# Altium footprint library NEST.PcbLib: 28 footprints (part 2 of 2)
Each footprint in its own frame and in the unit in brackets; x right, y up, seen from the top. Pads: shape width x height; smd on the part's side, far side on the other; paste and mask are expansions set on the pad; w line width, h text height; cw(c..) or ccw(c..) is an arc to the next point about the centre after c.
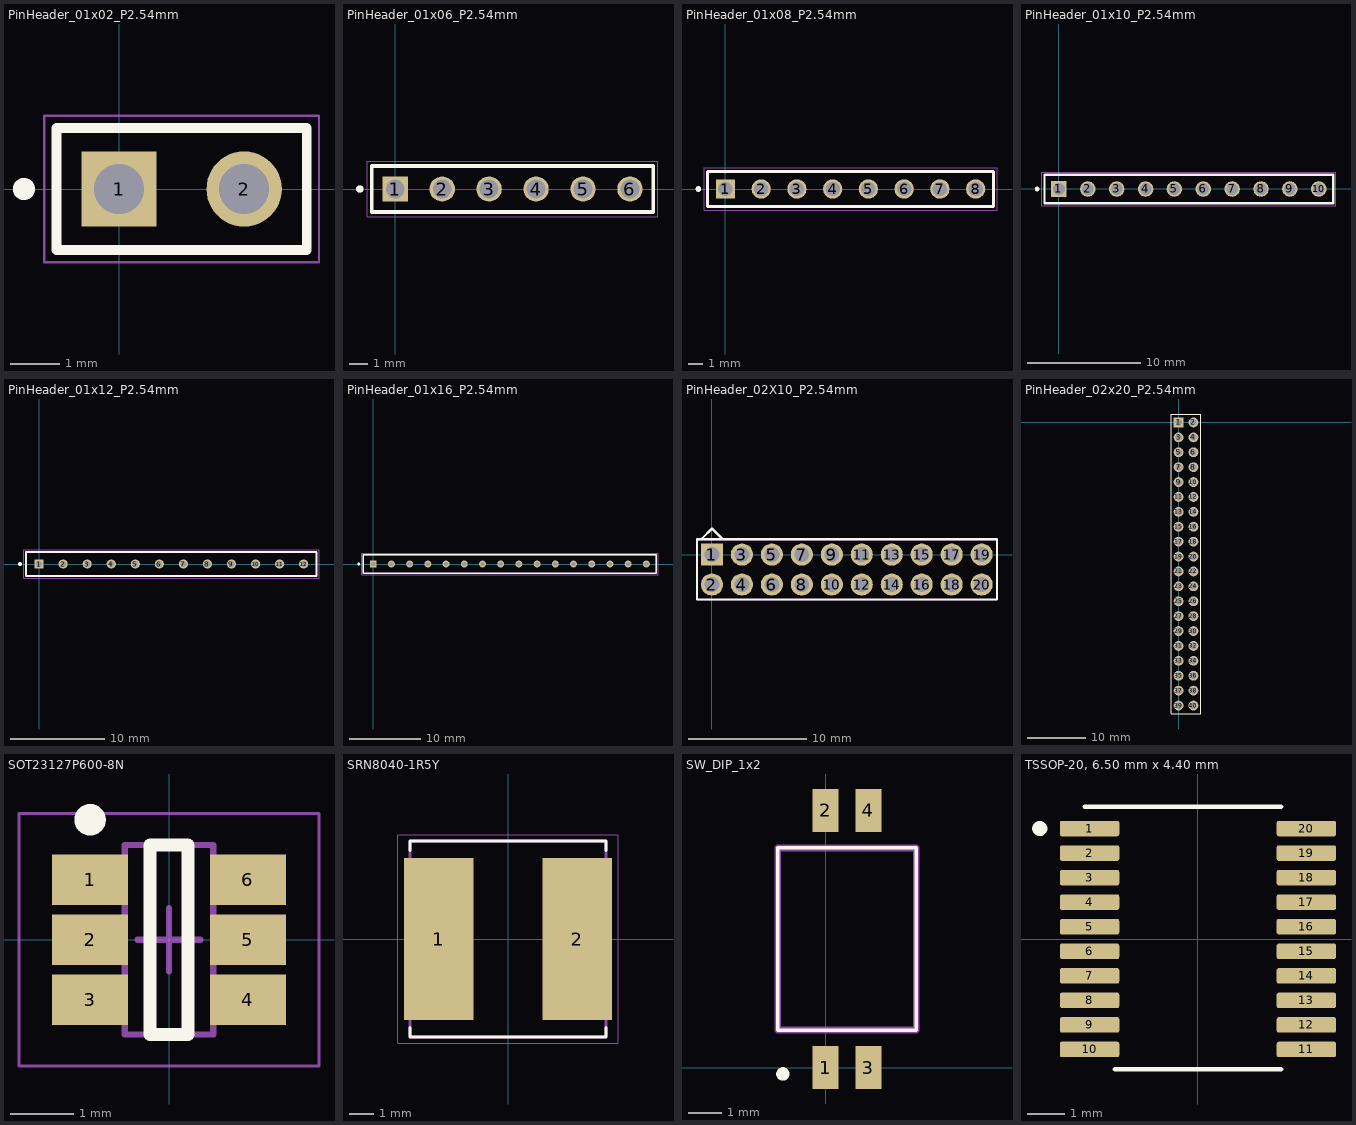
[diagram p1: the footprints below, top view; thin cyan lines are the x and y axes]

## PinHeader_01x02_P2.54mm [mm]
pads (2):
  rect 1.53x1.53 hole 1.02: 1(0,0)
  round 1.53 hole 1.02: 2(2.54,0)
Top Overlay:
  circle w0.25: c-1.93,0 r0.1
  lines w0.2: -1.27,-1.24 3.81,-1.24 3.81,1.24 -1.27,1.24 -1.27,-1.24
Mechanical 13:
  circle w0.2: c-1.93,0 r0.1
  lines w0.1: -1.27,-1.24 -1.27,1.24 3.81,1.24 3.81,-1.24 -1.27,-1.24
Mechanical 15:
  lines w0.05: -1.52,-1.49 -1.52,1.49 4.06,1.49 4.06,-1.49 -1.52,-1.49
3D body "Pin Header 1x2 TH Pitch 2.54mm.stp": height 9.5, standoff -3.2, extent -1.245,-1.347 3.835,1.193

## PinHeader_01x06_P2.54mm [mm]
pads (6):
  rect 1.37x1.37 / inner round 1.37 / far side rect 1.37x1.37 hole 1.02: 1(0,0)
  round 1.37 hole 1.02: 2(2.54,0) 3(5.08,0) 4(7.62,0) 5(10.16,0) 6(12.7,0)
Top Overlay:
  circle w0.2: c-1.92,0 r0.1
  lines w0.2: -1.27,-1.245 13.97,-1.245 13.97,1.245 -1.27,1.245 -1.27,-1.245
Mechanical 13:
  circle w0.2: c-1.92,0 r0.1
  lines w0.1: -1.27,-1.245 -1.27,1.245 13.97,1.245 13.97,-1.245 -1.27,-1.245
Mechanical 15:
  lines w0.05: -1.52,-1.495 -1.52,1.495 14.22,1.495 14.22,-1.495 -1.52,-1.495
3D body "Pin Header 1x6 TH Pitch 2.54mm.stp": height 9.5, standoff -3.2, extent -1.27,-1.296 13.97,1.245

## PinHeader_01x08_P2.54mm [mm]
pads (8):
  rect 1.37x1.37 / inner round 1.37 / far side rect 1.37x1.37 hole 1.02: 1(0,0)
  round 1.37 hole 1.02: 2(2.54,0) 3(5.08,0) 4(7.62,0) 5(10.16,0) 6(12.7,0) 7(15.24,0) 8(17.78,0)
Top Overlay:
  circle w0.2: c-1.92,0 r0.1
  lines w0.2: -1.27,-1.245 -1.27,1.245 19.05,1.245 19.05,-1.245 -1.27,-1.245
Mechanical 13:
  circle w0.2: c-1.92,0 r0.1
  lines w0.1: -1.27,-1.245 19.05,-1.245 19.05,1.245 -1.27,1.245 -1.27,-1.245
Mechanical 15:
  lines w0.05: -1.52,-1.495 19.3,-1.495 19.3,1.495 -1.52,1.495 -1.52,-1.495
3D body "Pin Header 1x8 TH Pitch 2.54mm.stp": height 9.5, standoff -3.2, extent -1.27,-1.27 19.05,1.27

## PinHeader_01x10_P2.54mm [mm]
pads (10):
  rect 1.37x1.37 / inner round 1.37 / far side rect 1.37x1.37 hole 1.02: 1(0,0)
  round 1.37 hole 1.02: 2(2.54,0) 3(5.08,0) 4(7.62,0) 5(10.16,0) 6(12.7,0) 7(15.24,0) 8(17.78,0) 9(20.32,0) 10(22.86,0)
Top Overlay:
  circle w0.2: c-1.92,0 r0.1
  lines w0.2: -1.27,-1.245 -1.27,1.245 24.13,1.245 24.13,-1.245 -1.27,-1.245
Mechanical 13:
  circle w0.2: c-1.92,0 r0.1
  lines w0.1: -1.27,-1.245 24.13,-1.245 24.13,1.245 -1.27,1.245 -1.27,-1.245
Mechanical 15:
  lines w0.05: -1.52,-1.495 24.38,-1.495 24.38,1.495 -1.52,1.495 -1.52,-1.495
3D body "Pin Header 1x10 TH Pitch 2.54mm.stp": height 9.5, standoff -3.2, extent -1.27,-1.27 24.13,1.27

## PinHeader_01x12_P2.54mm [mm]
pads (12):
  rect 0.96x0.96 hole 0.61: 1(0,0)
  round 0.96 hole 0.61: 2(2.54,0) 3(5.08,0) 4(7.62,0) 5(10.16,0) 6(12.7,0) 7(15.24,0) 8(17.78,0) 9(20.32,0) 10(22.86,0) 11(25.4,0) 12(27.94,0)
Top Overlay:
  circle w0.2: c-2.022,0 r0.1
  lines w0.2: -1.372,-1.27 29.312,-1.27 29.312,1.27 -1.372,1.27 -1.372,-1.27
Mechanical 13:
  circle w0.2: c-2.022,0 r0.1
  lines w0.1: -1.372,-1.27 29.312,-1.27 29.312,1.27 -1.372,1.27 -1.372,-1.27
Mechanical 15:
  lines w0.05: -1.622,-1.52 29.562,-1.52 29.562,1.52 -1.622,1.52 -1.622,-1.52
3D body "Pin Header 1x12 TH Pitch 2.54mm.stp": height 9.5, standoff -3.2, extent -1.27,-1.27 29.21,1.27

## PinHeader_01x16_P2.54mm [mm]
pads (16):
  rect 0.96x0.96 hole 0.61: 1(0,0)
  round 0.96 hole 0.61: 2(2.54,0) 3(5.08,0) 4(7.62,0) 5(10.16,0) 6(12.7,0) 7(15.24,0) 8(17.78,0) 9(20.32,0) 10(22.86,0) 11(25.4,0) 12(27.94,0) 13(30.48,0) 14(33.02,0) 15(35.56,0) 16(38.1,0)
Top Overlay:
  circle w0.2: c-2.022,0 r0.1
  lines w0.2: -1.372,-1.27 -1.372,1.27 39.472,1.27 39.472,-1.27 -1.372,-1.27
Mechanical 13:
  circle w0.2: c-2.022,0 r0.1
  lines w0.1: -1.372,-1.27 -1.372,1.27 39.472,1.27 39.472,-1.27 -1.372,-1.27
Mechanical 15:
  lines w0.05: -1.622,-1.52 -1.622,1.52 39.722,1.52 39.722,-1.52 -1.622,-1.52
3D body "Pin Header 1x16 TH Pitch 2.54mm.stp": height 9.5, standoff -3.2, extent -1.27,-1.27 39.37,1.27

## PinHeader_02X10_P2.54mm [mm]
pads (20):
  rect 1.875x1.875 hole 1.25: 1(0,0)
  round 1.875 hole 1.25: 2(0,-2.54) 3(2.54,0) 4(2.54,-2.54) 5(5.08,0) 6(5.08,-2.54) 7(7.62,0) 8(7.62,-2.54) 9(10.16,0) 10(10.16,-2.54) 11(12.7,0) 12(12.7,-2.54) 13(15.24,0) 14(15.24,-2.54) 15(17.78,0) 16(17.78,-2.54) 17(20.32,0) 18(20.32,-2.54) 19(22.86,0) 20(22.86,-2.54)
Top Overlay:
  lines w0.2: -1.26,1.305 -1.27,1.305 ; -0.864,1.346 0,2.21 0.838,1.372 ; -1.27,1.305 -1.27,-3.81 24.165,-3.81 24.165,1.305 -1.27,1.305
Mechanical 15:
  lines w0.1: -1.27,-3.81 24.13,-3.81 24.13,1.27 -1.27,1.27 -1.27,-3.81
3D body "TSW-110-07-S-D.stp": height 10.67, standoff -2.79, extent -1.27,-3.81 24.13,1.27

## PinHeader_02x20_P2.54mm [mm]
pads (40):
  rect 1.67x1.67 hole 1.1: 1(0,0)
  round 1.67 hole 1.1: 2(2.54,0) 3(0,-2.54) 4(2.54,-2.54) 5(0,-5.08) 6(2.54,-5.08) 7(0,-7.62) 8(2.54,-7.62) 9(0,-10.16) 10(2.54,-10.16) 11(0,-12.7) 12(2.54,-12.7) 13(0,-15.24) 14(2.54,-15.24) 15(0,-17.78) 16(2.54,-17.78) 17(0,-20.32) 18(2.54,-20.32) 19(0,-22.86) 20(2.54,-22.86) 21(0,-25.4) 22(2.54,-25.4) 23(0,-27.94) 24(2.54,-27.94) 25(0,-30.48) 26(2.54,-30.48) 27(0,-33.02) 28(2.54,-33.02) 29(0,-35.56) 30(2.54,-35.56) 31(0,-38.1) 32(2.54,-38.1) 33(0,-40.64) 34(2.54,-40.64) 35(0,-43.18) 36(2.54,-43.18) 37(0,-45.72) 38(2.54,-45.72) 39(0,-48.26) 40(2.54,-48.26)
Top Overlay:
  lines w0.2: -1.27,-49.705 -1.27,1.445 2.54,1.445 3.782,1.445 3.81,1.417 3.81,0 3.81,-49.705 -1.27,-49.705
3D body "M20-9762042.stp": height 8.38, standoff -3.1, extent -1.27,-49.53 3.81,1.27

## SOT23127P600-8N [mm]
height 1.1
pads (6):
  rect 1.2x0.8 smd: 1(-1.25,0.95) 2(-1.25,0) 3(-1.25,-0.95) 4(1.25,-0.95) 5(1.25,0) 6(1.25,0.95)
Top Overlay:
  circle w0.25: c-1.25,1.9 r0.125
  lines w0.2: -0.3,-1.5 -0.3,1.5 0.3,1.5 0.3,-1.5 -0.3,-1.5
Mechanical 13:
  lines w0.1: -0.7,-1.5 0.7,-1.5 0.7,1.5 -0.7,1.5 -0.7,-1.5
Mechanical 15:
  lines w0.05: -2.375,-2 2.375,-2 2.375,2 -2.375,2 -2.375,-2
  lines w0.1: -0.5,0 0.5,0 ; 0,-0.5 0,0.5
3D body "SOT23127P600-8N.step": height 1.1, standoff 0, extent -1.3,-1.5 1.3,1.5

## SRN8040-1R5Y [mm] "Power Inductors - SMD 1.5uH 30% SMD 8040"
pads (2):
  rect 2.85x6.6 smd: 1(-2.825,0) 2(2.825,0)
Top Overlay:
  lines w0.127: -4,-3.615 -4,-4 4,-4 4,-3.615 ; -4,3.615 -4,4 4,4 4,3.615
Mechanical 13:
  lines w0.127: -4,-4 -4,4 4,4 4,-4 -4,-4
Mechanical 15:
  lines w0.05: -4.5,-4.25 4.5,-4.25 4.5,4.25 -4.5,4.25 -4.5,-4.25
3D body "SRN8040-1RY.STEP": height 4, standoff 0, extent -4,-4.025 4,3.975

## SW_DIP_1x2 [mm] "DIP Switches / SIP Switches DIP Switch, SPST, 1.27 pitch, flat actuator, SMT, Tape and reel, 2 position, Black"
pads (4):
  rect 0.76x1.27 smd: 1(0,0) 2(0,7.62) 3(1.27,0) 4(1.27,7.62)
Top Overlay:
  lines w0.1: -1.42,1.11 -1.42,6.51 2.69,6.51 2.69,1.11 -1.42,1.11
  lines w0.2: -1.365,-0.19 cw(c-1.265,-0.19) -1.165,-0.19 cw(c-1.265,-0.19) -1.365,-0.19
Mechanical 15:
  lines w0.2: -1.42,1.11 -1.42,6.51 2.69,6.51 2.69,1.11 -1.42,1.11
3D body "DS05-127-2-02BK-SMT-TR.stp": height 2.4, standoff 0, extent -1.443,-0.35 2.667,7.95

## TSSOP-20, 6.50 mm x 4.40 mm [mm] "TSOP, 20-Leads, Body 6.50x4.40mm, Pitch 0.65mm, IPC Low Density"
pads (20):
  rrect25% 1.57x0.41 smd mask+0.05: 1(-2.87,2.925) 2(-2.87,2.275) 3(-2.87,1.625) 4(-2.87,0.975) 5(-2.87,0.325) 6(-2.87,-0.325) 7(-2.87,-0.975) 8(-2.87,-1.625) 9(-2.87,-2.275) 10(-2.87,-2.925) 11(2.87,-2.925) 12(2.87,-2.275) 13(2.87,-1.625) 14(2.87,-0.975) 15(2.87,-0.325) 16(2.87,0.325) 17(2.87,0.975) 18(2.87,1.625) 19(2.87,2.275) 20(2.87,2.925)
Top Overlay:
  circle w0.2: c-4.19,2.925 r0.1
  lines w0.127: -3,3.5 2.2,3.5 ; -2.2,-3.45 2.2,-3.45
3D body "TXB0108PWR.STEP": height 1.2, standoff 0, extent -3.225,-3.275 3.175,3.225